# Altium schematic symbol library jlcpcb_2025_04_capacitors_extended_0603.schlib: 3668 symbols (part 19 of 20) (continued)
## TCC0603COG150K500CT
designator C?  Capacitance: 15pF  (hidden comment: *)
Capacitor, Ceramic (MLCC), 15pF, ±10%, 50V, C0G, ±10%, SMD 0603; Manufacturer: CCTC; Manufacturer Part Number: TCC0603COG150K500CT; Package Size: 0603; JLCPCB Basic Part: No; JLCPCB Part Number: C696849; Supplier 1: LCSC; Category: Capacitors - MLCC; Supplier Part Number 1: C696849; Tolerance: ±10%; Voltage Rating: 50V; Temperature Coefficient: C0G; RoHS: Yes; ComponentLink1Description: Datasheet; ComponentLink1URL: https://wmsc.lcsc.com/wmsc/upload/file/pdf/v2/lcsc/2304140030_CCTC-TCC0603COG150K500CT_C696849.pdf; ComponentLink2Description: JLCPCB Part URL; ComponentLink2URL: https://jlcpcb.com/partdetail/C696849; ComponentLink3Description: LCSC Part URL; ComponentLink3URL: https://lcsc.com/product-detail/Multilayer-Ceramic-Capacitors-MLCC---SMD-SMT_CCTC-CCTC-TCC0603COG150K500CT_C696849.html
footprint CAP-0603 (0603 (1608M) Capacitor)
pins: 1, 2

## TCC0603COG180J500CT
designator C?  Capacitance: 18pF  (hidden comment: *)
Capacitor, Ceramic (MLCC), 18pF, ±5%, 50V, C0G, ±5%, SMD 0603; Manufacturer: CCTC; Manufacturer Part Number: TCC0603COG180J500CT; Package Size: 0603; JLCPCB Basic Part: No; JLCPCB Part Number: C376770; Supplier 1: LCSC; Category: Capacitors - MLCC; Supplier Part Number 1: C376770; Tolerance: ±5%; Voltage Rating: 50V; Temperature Coefficient: C0G; RoHS: Yes; ComponentLink1Description: Datasheet; ComponentLink1URL: https://wmsc.lcsc.com/wmsc/upload/file/pdf/v2/lcsc/2304140030_CCTC-TCC0603COG180J500CT_C376770.pdf; ComponentLink2Description: JLCPCB Part URL; ComponentLink2URL: https://jlcpcb.com/partdetail/C376770; ComponentLink3Description: LCSC Part URL; ComponentLink3URL: https://lcsc.com/product-detail/Multilayer-Ceramic-Capacitors-MLCC---SMD-SMT_CCTC-CCTC-TCC0603COG180J500CT_C376770.html
footprint CAP-0603 (0603 (1608M) Capacitor)
pins: 1, 2

## TCC0603COG181J500CT
designator C?  Capacitance: 180pF  (hidden comment: *)
Capacitor, Ceramic (MLCC), 180pF, ±5%, 50V, C0G, ±5%, SMD 0603; Manufacturer: CCTC; Manufacturer Part Number: TCC0603COG181J500CT; Package Size: 0603; JLCPCB Basic Part: No; JLCPCB Part Number: C376771; Supplier 1: LCSC; Category: Capacitors - MLCC; Supplier Part Number 1: C376771; Tolerance: ±5%; Voltage Rating: 50V; Temperature Coefficient: C0G; RoHS: Yes; ComponentLink1Description: Datasheet; ComponentLink1URL: https://wmsc.lcsc.com/wmsc/upload/file/pdf/v2/lcsc/2304140030_CCTC-TCC0603COG181J500CT_C376771.pdf; ComponentLink2Description: JLCPCB Part URL; ComponentLink2URL: https://jlcpcb.com/partdetail/C376771; ComponentLink3Description: LCSC Part URL; ComponentLink3URL: https://lcsc.com/product-detail/Multilayer-Ceramic-Capacitors-MLCC---SMD-SMT_CCTC-CCTC-TCC0603COG181J500CT_C376771.html
footprint CAP-0603 (0603 (1608M) Capacitor)
pins: 1, 2

## TCC0603COG200J101CT
designator C?  Capacitance: 20pF  (hidden comment: *)
Capacitor, Ceramic (MLCC), 20pF, ±5%, 100V, C0G, ±5%, SMD 0603; Manufacturer: CCTC; Manufacturer Part Number: TCC0603COG200J101CT; Package Size: 0603; JLCPCB Basic Part: No; JLCPCB Part Number: C880611; Supplier 1: LCSC; Category: Capacitors - MLCC; Supplier Part Number 1: C880611; Tolerance: ±5%; Voltage Rating: 100V; Temperature Coefficient: C0G; RoHS: Yes; ComponentLink1Description: Datasheet; ComponentLink1URL: https://wmsc.lcsc.com/wmsc/upload/file/pdf/v2/lcsc/2304140030_CCTC-TCC0603COG200J101CT_C880611.pdf; ComponentLink2Description: JLCPCB Part URL; ComponentLink2URL: https://jlcpcb.com/partdetail/C880611; ComponentLink3Description: LCSC Part URL; ComponentLink3URL: https://lcsc.com/product-detail/Multilayer-Ceramic-Capacitors-MLCC---SMD-SMT_CCTC-CCTC-TCC0603COG200J101CT_C880611.html
footprint CAP-0603 (0603 (1608M) Capacitor)
pins: 1, 2

## TCC0603COG200J251CT
designator C?  Capacitance: 20pF  (hidden comment: *)
Capacitor, Ceramic (MLCC), 20pF, ±5%, 250V, C0G, ±5%, SMD 0603; Manufacturer: CCTC; Manufacturer Part Number: TCC0603COG200J251CT; Package Size: 0603; JLCPCB Basic Part: No; JLCPCB Part Number: C880626; Supplier 1: LCSC; Category: Capacitors - MLCC; Supplier Part Number 1: C880626; Tolerance: ±5%; Voltage Rating: 250V; Temperature Coefficient: C0G; RoHS: Yes; ComponentLink1Description: Datasheet; ComponentLink1URL: https://wmsc.lcsc.com/wmsc/upload/file/pdf/v2/lcsc/2304140030_CCTC-TCC0603COG200J251CT_C880626.pdf; ComponentLink2Description: JLCPCB Part URL; ComponentLink2URL: https://jlcpcb.com/partdetail/C880626; ComponentLink3Description: LCSC Part URL; ComponentLink3URL: https://lcsc.com/product-detail/Multilayer-Ceramic-Capacitors-MLCC---SMD-SMT_CCTC-CCTC-TCC0603COG200J251CT_C880626.html
footprint CAP-0603 (0603 (1608M) Capacitor)
pins: 1, 2

## TCC0603COG200J500CT
designator C?  Capacitance: 20pF  (hidden comment: *)
Capacitor, Ceramic (MLCC), 20pF, ±5%, 50V, C0G, ±5%, SMD 0603; Manufacturer: CCTC; Manufacturer Part Number: TCC0603COG200J500CT; Package Size: 0603; JLCPCB Basic Part: No; JLCPCB Part Number: C376774; Supplier 1: LCSC; Category: Capacitors - MLCC; Supplier Part Number 1: C376774; Tolerance: ±5%; Voltage Rating: 50V; Temperature Coefficient: C0G; RoHS: Yes; ComponentLink1Description: Datasheet; ComponentLink1URL: https://wmsc.lcsc.com/wmsc/upload/file/pdf/v2/lcsc/2304140030_CCTC-TCC0603COG200J500CT_C376774.pdf; ComponentLink2Description: JLCPCB Part URL; ComponentLink2URL: https://jlcpcb.com/partdetail/C376774; ComponentLink3Description: LCSC Part URL; ComponentLink3URL: https://lcsc.com/product-detail/Multilayer-Ceramic-Capacitors-MLCC---SMD-SMT_CCTC-CCTC-TCC0603COG200J500CT_C376774.html
footprint CAP-0603 (0603 (1608M) Capacitor)
pins: 1, 2

## TCC0603COG200K500CT
designator C?  Capacitance: 20pF  (hidden comment: *)
Capacitor, Ceramic (MLCC), 20pF, ±10%, 50V, C0G, ±10%, SMD 0603; Manufacturer: CCTC; Manufacturer Part Number: TCC0603COG200K500CT; Package Size: 0603; JLCPCB Basic Part: No; JLCPCB Part Number: C713506; Supplier 1: LCSC; Category: Capacitors - MLCC; Supplier Part Number 1: C713506; Tolerance: ±10%; Voltage Rating: 50V; Temperature Coefficient: C0G; RoHS: Yes; ComponentLink1Description: Datasheet; ComponentLink1URL: https://wmsc.lcsc.com/wmsc/upload/file/pdf/v2/lcsc/2304140030_CCTC-TCC0603COG200K500CT_C713506.pdf; ComponentLink2Description: JLCPCB Part URL; ComponentLink2URL: https://jlcpcb.com/partdetail/C713506; ComponentLink3Description: LCSC Part URL; ComponentLink3URL: https://lcsc.com/product-detail/Multilayer-Ceramic-Capacitors-MLCC---SMD-SMT_CCTC-CCTC-TCC0603COG200K500CT_C713506.html
footprint CAP-0603 (0603 (1608M) Capacitor)
pins: 1, 2

## TCC0603COG220J101CT
designator C?  Capacitance: 22pF  (hidden comment: *)
Capacitor, Ceramic (MLCC), 22pF, ±5%, 100V, C0G, ±5%, SMD 0603; Manufacturer: CCTC; Manufacturer Part Number: TCC0603COG220J101CT; Package Size: 0603; JLCPCB Basic Part: No; JLCPCB Part Number: C880642; Supplier 1: LCSC; Category: Capacitors - MLCC; Supplier Part Number 1: C880642; Tolerance: ±5%; Voltage Rating: 100V; Temperature Coefficient: C0G; RoHS: Yes; ComponentLink1Description: Datasheet; ComponentLink1URL: https://wmsc.lcsc.com/wmsc/upload/file/pdf/v2/lcsc/2304140030_CCTC-TCC0603COG220J101CT_C880642.pdf; ComponentLink2Description: JLCPCB Part URL; ComponentLink2URL: https://jlcpcb.com/partdetail/C880642; ComponentLink3Description: LCSC Part URL; ComponentLink3URL: https://lcsc.com/product-detail/Multilayer-Ceramic-Capacitors-MLCC---SMD-SMT_CCTC-CCTC-TCC0603COG220J101CT_C880642.html
footprint CAP-0603 (0603 (1608M) Capacitor)
pins: 1, 2

## TCC0603COG220J500CT
designator C?  Capacitance: 22pF  (hidden comment: *)
Capacitor, Ceramic (MLCC), 22pF, ±5%, 50V, C0G, ±5%, SMD 0603; Manufacturer: CCTC; Manufacturer Part Number: TCC0603COG220J500CT; Package Size: 0603; JLCPCB Basic Part: No; JLCPCB Part Number: C376775; Supplier 1: LCSC; Category: Capacitors - MLCC; Supplier Part Number 1: C376775; Tolerance: ±5%; Voltage Rating: 50V; Temperature Coefficient: C0G; RoHS: Yes; ComponentLink1Description: Datasheet; ComponentLink1URL: https://wmsc.lcsc.com/wmsc/upload/file/pdf/v2/lcsc/2304140030_CCTC-TCC0603COG220J500CT_C376775.pdf; ComponentLink2Description: JLCPCB Part URL; ComponentLink2URL: https://jlcpcb.com/partdetail/C376775; ComponentLink3Description: LCSC Part URL; ComponentLink3URL: https://lcsc.com/product-detail/Multilayer-Ceramic-Capacitors-MLCC---SMD-SMT_CCTC-CCTC-TCC0603COG220J500CT_C376775.html
footprint CAP-0603 (0603 (1608M) Capacitor)
pins: 1, 2

## TCC0603COG220K500CT
designator C?  Capacitance: 22pF  (hidden comment: *)
Capacitor, Ceramic (MLCC), 22pF, ±10%, null, null, ±10%, SMD 0603; Manufacturer: CCTC; Manufacturer Part Number: TCC0603COG220K500CT; Package Size: 0603; JLCPCB Basic Part: No; JLCPCB Part Number: C5360783; Supplier 1: LCSC; Category: Capacitors - MLCC; Supplier Part Number 1: C5360783; Tolerance: ±10%; Voltage Rating: null; Temperature Coefficient: null; RoHS: Yes; ComponentLink1Description: Datasheet; ComponentLink1URL: https://wmsc.lcsc.com/wmsc/upload/file/pdf/v2/lcsc/2302141837_CCTC-TCC0603COG220K500CT_C5360783.pdf; ComponentLink2Description: JLCPCB Part URL; ComponentLink2URL: https://jlcpcb.com/partdetail/C5360783; ComponentLink3Description: LCSC Part URL; ComponentLink3URL: https://lcsc.com/product-detail/Multilayer-Ceramic-Capacitors-MLCC---SMD-SMT_CCTC-CCTC-TCC0603COG220K500CT_C5360783.html
footprint CAP-0603 (0603 (1608M) Capacitor)
pins: 1, 2

## TCC0603COG221J500CT
designator C?  Capacitance: 220pF  (hidden comment: *)
Capacitor, Ceramic (MLCC), 220pF, ±5%, 50V, C0G, ±5%, SMD 0603; Manufacturer: CCTC; Manufacturer Part Number: TCC0603COG221J500CT; Package Size: 0603; JLCPCB Basic Part: No; JLCPCB Part Number: C376776; Supplier 1: LCSC; Category: Capacitors - MLCC; Supplier Part Number 1: C376776; Tolerance: ±5%; Voltage Rating: 50V; Temperature Coefficient: C0G; RoHS: Yes; ComponentLink1Description: Datasheet; ComponentLink1URL: https://wmsc.lcsc.com/wmsc/upload/file/pdf/v2/lcsc/2304140030_CCTC-TCC0603COG221J500CT_C376776.pdf; ComponentLink2Description: JLCPCB Part URL; ComponentLink2URL: https://jlcpcb.com/partdetail/C376776; ComponentLink3Description: LCSC Part URL; ComponentLink3URL: https://lcsc.com/product-detail/Multilayer-Ceramic-Capacitors-MLCC---SMD-SMT_CCTC-CCTC-TCC0603COG221J500CT_C376776.html
footprint CAP-0603 (0603 (1608M) Capacitor)
pins: 1, 2

## TCC0603COG222J500CT
designator C?  Capacitance: 2.2nF  (hidden comment: *)
Capacitor, Ceramic (MLCC), 2.2nF, ±5%, 50V, C0G, ±5%, SMD 0603; Manufacturer: CCTC; Manufacturer Part Number: TCC0603COG222J500CT; Package Size: 0603; JLCPCB Basic Part: No; JLCPCB Part Number: C380311; Supplier 1: LCSC; Category: Capacitors - MLCC; Supplier Part Number 1: C380311; Tolerance: ±5%; Voltage Rating: 50V; Temperature Coefficient: C0G; RoHS: Yes; ComponentLink1Description: Datasheet; ComponentLink1URL: https://wmsc.lcsc.com/wmsc/upload/file/pdf/v2/lcsc/2304140030_CCTC-TCC0603COG222J500CT_C380311.pdf; ComponentLink2Description: JLCPCB Part URL; ComponentLink2URL: https://jlcpcb.com/partdetail/C380311; ComponentLink3Description: LCSC Part URL; ComponentLink3URL: https://lcsc.com/product-detail/Multilayer-Ceramic-Capacitors-MLCC---SMD-SMT_CCTC-CCTC-TCC0603COG222J500CT_C380311.html
footprint CAP-0603 (0603 (1608M) Capacitor)
pins: 1, 2

## TCC0603COG240G500CT
designator C?  Capacitance: 24pF  (hidden comment: *)
Capacitor, Ceramic (MLCC), 24pF, ±2%, null, null, ±2%, SMD 0603; Manufacturer: CCTC; Manufacturer Part Number: TCC0603COG240G500CT; Package Size: 0603; JLCPCB Basic Part: No; JLCPCB Part Number: C5375817; Supplier 1: LCSC; Category: Capacitors - MLCC; Supplier Part Number 1: C5375817; Tolerance: ±2%; Voltage Rating: null; Temperature Coefficient: null; RoHS: Yes; ComponentLink1Description: Datasheet; ComponentLink2Description: JLCPCB Part URL; ComponentLink2URL: https://jlcpcb.com/partdetail/C5375817; ComponentLink3Description: LCSC Part URL; ComponentLink3URL: https://lcsc.com/product-detail/Multilayer-Ceramic-Capacitors-MLCC---SMD-SMT_CCTC-CCTC-TCC0603COG240G500CT_C5375817.html
footprint CAP-0603 (0603 (1608M) Capacitor)
pins: 1, 2

## TCC0603COG240J500CT
designator C?  Capacitance: 24pF  (hidden comment: *)
Capacitor, Ceramic (MLCC), 24pF, ±5%, 50V, C0G, ±5%, SMD 0603; Manufacturer: CCTC; Manufacturer Part Number: TCC0603COG240J500CT; Package Size: 0603; JLCPCB Basic Part: No; JLCPCB Part Number: C376777; Supplier 1: LCSC; Category: Capacitors - MLCC; Supplier Part Number 1: C376777; Tolerance: ±5%; Voltage Rating: 50V; Temperature Coefficient: C0G; RoHS: Yes; ComponentLink1Description: Datasheet; ComponentLink1URL: https://wmsc.lcsc.com/wmsc/upload/file/pdf/v2/lcsc/2304140030_CCTC-TCC0603COG240J500CT_C376777.pdf; ComponentLink2Description: JLCPCB Part URL; ComponentLink2URL: https://jlcpcb.com/partdetail/C376777; ComponentLink3Description: LCSC Part URL; ComponentLink3URL: https://lcsc.com/product-detail/Multilayer-Ceramic-Capacitors-MLCC---SMD-SMT_CCTC-CCTC-TCC0603COG240J500CT_C376777.html
footprint CAP-0603 (0603 (1608M) Capacitor)
pins: 1, 2

## TCC0603COG250G500CT
designator C?  Capacitance: 25pF  (hidden comment: *)
Capacitor, Ceramic (MLCC), 25pF, ±2%, 50V, null, ±2%, SMD 0603; Manufacturer: CCTC; Manufacturer Part Number: TCC0603COG250G500CT; Package Size: 0603; JLCPCB Basic Part: No; JLCPCB Part Number: C7393882; Supplier 1: LCSC; Category: Capacitors - MLCC; Supplier Part Number 1: C7393882; Tolerance: ±2%; Voltage Rating: 50V; Temperature Coefficient: null; RoHS: Yes; ComponentLink1Description: Datasheet; ComponentLink1URL: https://wmsc.lcsc.com/wmsc/upload/file/pdf/v2/lcsc/2306211554_CCTC-TCC0603COG250G500CT_C7393882.pdf; ComponentLink2Description: JLCPCB Part URL; ComponentLink2URL: https://jlcpcb.com/partdetail/C7393882; ComponentLink3Description: LCSC Part URL; ComponentLink3URL: https://lcsc.com/product-detail/Multilayer-Ceramic-Capacitors-MLCC---SMD-SMT_CCTC-CCTC-TCC0603COG250G500CT_C7393882.html
footprint CAP-0603 (0603 (1608M) Capacitor)
pins: 1, 2

## TCC0603COG250J500CT
designator C?  Capacitance: 25pF  (hidden comment: *)
Capacitor, Ceramic (MLCC), 25pF, ±5%, 50V, C0G, ±5%, SMD 0603; Manufacturer: CCTC; Manufacturer Part Number: TCC0603COG250J500CT; Package Size: 0603; JLCPCB Basic Part: No; JLCPCB Part Number: C282499; Supplier 1: LCSC; Category: Capacitors - MLCC; Supplier Part Number 1: C282499; Tolerance: ±5%; Voltage Rating: 50V; Temperature Coefficient: C0G; RoHS: Yes; ComponentLink1Description: Datasheet; ComponentLink1URL: https://wmsc.lcsc.com/wmsc/upload/file/pdf/v2/lcsc/2304140030_CCTC-TCC0603COG250J500CT_C282499.pdf; ComponentLink2Description: JLCPCB Part URL; ComponentLink2URL: https://jlcpcb.com/partdetail/C282499; ComponentLink3Description: LCSC Part URL; ComponentLink3URL: https://lcsc.com/product-detail/Multilayer-Ceramic-Capacitors-MLCC---SMD-SMT_CCTC-CCTC-TCC0603COG250J500CT_C282499.html
footprint CAP-0603 (0603 (1608M) Capacitor)
pins: 1, 2

## TCC0603COG270J101CT
designator C?  Capacitance: 27pF  (hidden comment: *)
Capacitor, Ceramic (MLCC), 27pF, ±5%, 100V, C0G, ±5%, SMD 0603; Manufacturer: CCTC; Manufacturer Part Number: TCC0603COG270J101CT; Package Size: 0603; JLCPCB Basic Part: No; JLCPCB Part Number: C880634; Supplier 1: LCSC; Category: Capacitors - MLCC; Supplier Part Number 1: C880634; Tolerance: ±5%; Voltage Rating: 100V; Temperature Coefficient: C0G; RoHS: Yes; ComponentLink1Description: Datasheet; ComponentLink1URL: https://wmsc.lcsc.com/wmsc/upload/file/pdf/v2/lcsc/2304140030_CCTC-TCC0603COG270J101CT_C880634.pdf; ComponentLink2Description: JLCPCB Part URL; ComponentLink2URL: https://jlcpcb.com/partdetail/C880634; ComponentLink3Description: LCSC Part URL; ComponentLink3URL: https://lcsc.com/product-detail/Multilayer-Ceramic-Capacitors-MLCC---SMD-SMT_CCTC-CCTC-TCC0603COG270J101CT_C880634.html
footprint CAP-0603 (0603 (1608M) Capacitor)
pins: 1, 2

## TCC0603COG270J500CT
designator C?  Capacitance: 27pF  (hidden comment: *)
Capacitor, Ceramic (MLCC), 27pF, ±5%, 50V, C0G, ±5%, SMD 0603; Manufacturer: CCTC; Manufacturer Part Number: TCC0603COG270J500CT; Package Size: 0603; JLCPCB Basic Part: No; JLCPCB Part Number: C376778; Supplier 1: LCSC; Category: Capacitors - MLCC; Supplier Part Number 1: C376778; Tolerance: ±5%; Voltage Rating: 50V; Temperature Coefficient: C0G; RoHS: Yes; ComponentLink1Description: Datasheet; ComponentLink1URL: https://wmsc.lcsc.com/wmsc/upload/file/pdf/v2/lcsc/2304140030_CCTC-TCC0603COG270J500CT_C376778.pdf; ComponentLink2Description: JLCPCB Part URL; ComponentLink2URL: https://jlcpcb.com/partdetail/C376778; ComponentLink3Description: LCSC Part URL; ComponentLink3URL: https://lcsc.com/product-detail/Multilayer-Ceramic-Capacitors-MLCC---SMD-SMT_CCTC-CCTC-TCC0603COG270J500CT_C376778.html
footprint CAP-0603 (0603 (1608M) Capacitor)
pins: 1, 2

## TCC0603COG271J500CT
designator C?  Capacitance: 270pF  (hidden comment: *)
Capacitor, Ceramic (MLCC), 270pF, ±5%, 50V, C0G, ±5%, SMD 0603; Manufacturer: CCTC; Manufacturer Part Number: TCC0603COG271J500CT; Package Size: 0603; JLCPCB Basic Part: No; JLCPCB Part Number: C376779; Supplier 1: LCSC; Category: Capacitors - MLCC; Supplier Part Number 1: C376779; Tolerance: ±5%; Voltage Rating: 50V; Temperature Coefficient: C0G; RoHS: Yes; ComponentLink1Description: Datasheet; ComponentLink1URL: https://wmsc.lcsc.com/wmsc/upload/file/pdf/v2/lcsc/2304140030_CCTC-TCC0603COG271J500CT_C376779.pdf; ComponentLink2Description: JLCPCB Part URL; ComponentLink2URL: https://jlcpcb.com/partdetail/C376779; ComponentLink3Description: LCSC Part URL; ComponentLink3URL: https://lcsc.com/product-detail/Multilayer-Ceramic-Capacitors-MLCC---SMD-SMT_CCTC-CCTC-TCC0603COG271J500CT_C376779.html
footprint CAP-0603 (0603 (1608M) Capacitor)
pins: 1, 2

## TCC0603COG300J101CT
designator C?  Capacitance: 30pF  (hidden comment: *)
Capacitor, Ceramic (MLCC), 30pF, ±5%, 100V, C0G, ±5%, SMD 0603; Manufacturer: CCTC; Manufacturer Part Number: TCC0603COG300J101CT; Package Size: 0603; JLCPCB Basic Part: No; JLCPCB Part Number: C696865; Supplier 1: LCSC; Category: Capacitors - MLCC; Supplier Part Number 1: C696865; Tolerance: ±5%; Voltage Rating: 100V; Temperature Coefficient: C0G; RoHS: Yes; ComponentLink1Description: Datasheet; ComponentLink1URL: https://wmsc.lcsc.com/wmsc/upload/file/pdf/v2/lcsc/2304140030_CCTC-TCC0603COG300J101CT_C696865.pdf; ComponentLink2Description: JLCPCB Part URL; ComponentLink2URL: https://jlcpcb.com/partdetail/C696865; ComponentLink3Description: LCSC Part URL; ComponentLink3URL: https://lcsc.com/product-detail/Multilayer-Ceramic-Capacitors-MLCC---SMD-SMT_CCTC-CCTC-TCC0603COG300J101CT_C696865.html
footprint CAP-0603 (0603 (1608M) Capacitor)
pins: 1, 2

## TCC0603COG300J251CT
designator C?  Capacitance: 30pF  (hidden comment: *)
Capacitor, Ceramic (MLCC), 30pF, ±5%, 250V, null, ±5%, SMD 0603; Manufacturer: CCTC; Manufacturer Part Number: TCC0603COG300J251CT; Package Size: 0603; JLCPCB Basic Part: No; JLCPCB Part Number: C5360861; Supplier 1: LCSC; Category: Capacitors - MLCC; Supplier Part Number 1: C5360861; Tolerance: ±5%; Voltage Rating: 250V; Temperature Coefficient: null; RoHS: Yes; ComponentLink1Description: Datasheet; ComponentLink1URL: https://wmsc.lcsc.com/wmsc/upload/file/pdf/v2/lcsc/2302141837_CCTC-TCC0603COG300J251CT_C5360861.pdf; ComponentLink2Description: JLCPCB Part URL; ComponentLink2URL: https://jlcpcb.com/partdetail/C5360861; ComponentLink3Description: LCSC Part URL; ComponentLink3URL: https://lcsc.com/product-detail/Multilayer-Ceramic-Capacitors-MLCC---SMD-SMT_CCTC-CCTC-TCC0603COG300J251CT_C5360861.html
footprint CAP-0603 (0603 (1608M) Capacitor)
pins: 1, 2

## TCC0603COG300J500CT
designator C?  Capacitance: 30pF  (hidden comment: *)
Capacitor, Ceramic (MLCC), 30pF, ±5%, 50V, C0G, ±5%, SMD 0603; Manufacturer: CCTC; Manufacturer Part Number: TCC0603COG300J500CT; Package Size: 0603; JLCPCB Basic Part: No; JLCPCB Part Number: C376782; Supplier 1: LCSC; Category: Capacitors - MLCC; Supplier Part Number 1: C376782; Tolerance: ±5%; Voltage Rating: 50V; Temperature Coefficient: C0G; RoHS: Yes; ComponentLink1Description: Datasheet; ComponentLink1URL: https://wmsc.lcsc.com/wmsc/upload/file/pdf/v2/lcsc/2304140030_CCTC-TCC0603COG300J500CT_C376782.pdf; ComponentLink2Description: JLCPCB Part URL; ComponentLink2URL: https://jlcpcb.com/partdetail/C376782; ComponentLink3Description: LCSC Part URL; ComponentLink3URL: https://lcsc.com/product-detail/Multilayer-Ceramic-Capacitors-MLCC---SMD-SMT_CCTC-CCTC-TCC0603COG300J500CT_C376782.html
footprint CAP-0603 (0603 (1608M) Capacitor)
pins: 1, 2

## TCC0603COG300K500CT
designator C?  Capacitance: 30pF  (hidden comment: *)
Capacitor, Ceramic (MLCC), 30pF, ±10%, 50V, C0G, ±10%, SMD 0603; Manufacturer: CCTC; Manufacturer Part Number: TCC0603COG300K500CT; Package Size: 0603; JLCPCB Basic Part: No; JLCPCB Part Number: C713507; Supplier 1: LCSC; Category: Capacitors - MLCC; Supplier Part Number 1: C713507; Tolerance: ±10%; Voltage Rating: 50V; Temperature Coefficient: C0G; RoHS: Yes; ComponentLink1Description: Datasheet; ComponentLink1URL: https://wmsc.lcsc.com/wmsc/upload/file/pdf/v2/lcsc/2304140030_CCTC-TCC0603COG300K500CT_C713507.pdf; ComponentLink2Description: JLCPCB Part URL; ComponentLink2URL: https://jlcpcb.com/partdetail/C713507; ComponentLink3Description: LCSC Part URL; ComponentLink3URL: https://lcsc.com/product-detail/Multilayer-Ceramic-Capacitors-MLCC---SMD-SMT_CCTC-CCTC-TCC0603COG300K500CT_C713507.html
footprint CAP-0603 (0603 (1608M) Capacitor)
pins: 1, 2

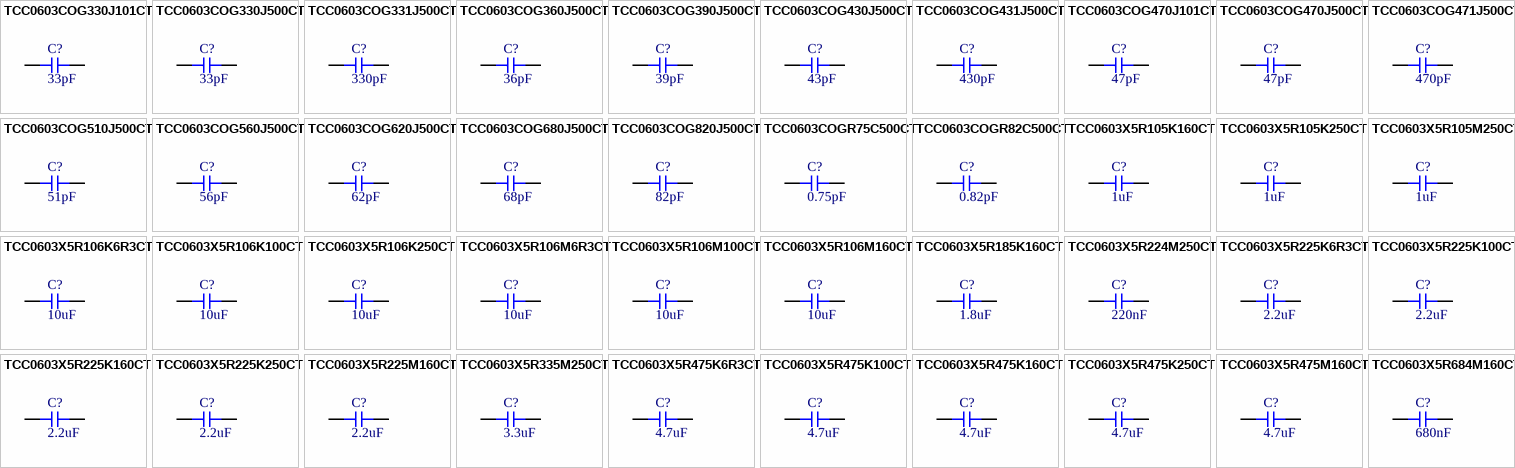
[diagram p86: symbols TCC0603COG330J101CT to TCC0603X5R684M160CT]

## TCC0603COG330J101CT
designator C?  Capacitance: 33pF  (hidden comment: *)
Capacitor, Ceramic (MLCC), 33pF, ±5%, 100V, C0G, ±5%, SMD 0603; Manufacturer: CCTC; Manufacturer Part Number: TCC0603COG330J101CT; Package Size: 0603; JLCPCB Basic Part: No; JLCPCB Part Number: C880633; Supplier 1: LCSC; Category: Capacitors - MLCC; Supplier Part Number 1: C880633; Tolerance: ±5%; Voltage Rating: 100V; Temperature Coefficient: C0G; RoHS: Yes; ComponentLink1Description: Datasheet; ComponentLink1URL: https://wmsc.lcsc.com/wmsc/upload/file/pdf/v2/lcsc/2304140030_CCTC-TCC0603COG330J101CT_C880633.pdf; ComponentLink2Description: JLCPCB Part URL; ComponentLink2URL: https://jlcpcb.com/partdetail/C880633; ComponentLink3Description: LCSC Part URL; ComponentLink3URL: https://lcsc.com/product-detail/Multilayer-Ceramic-Capacitors-MLCC---SMD-SMT_CCTC-CCTC-TCC0603COG330J101CT_C880633.html
footprint CAP-0603 (0603 (1608M) Capacitor)
pins: 1, 2

## TCC0603COG330J500CT
designator C?  Capacitance: 33pF  (hidden comment: *)
Capacitor, Ceramic (MLCC), 33pF, ±5%, 50V, C0G, ±5%, SMD 0603; Manufacturer: CCTC; Manufacturer Part Number: TCC0603COG330J500CT; Package Size: 0603; JLCPCB Basic Part: No; JLCPCB Part Number: C282501; Supplier 1: LCSC; Category: Capacitors - MLCC; Supplier Part Number 1: C282501; Tolerance: ±5%; Voltage Rating: 50V; Temperature Coefficient: C0G; RoHS: Yes; ComponentLink1Description: Datasheet; ComponentLink1URL: https://wmsc.lcsc.com/wmsc/upload/file/pdf/v2/lcsc/2304140030_CCTC-TCC0603COG330J500CT_C282501.pdf; ComponentLink2Description: JLCPCB Part URL; ComponentLink2URL: https://jlcpcb.com/partdetail/C282501; ComponentLink3Description: LCSC Part URL; ComponentLink3URL: https://lcsc.com/product-detail/Multilayer-Ceramic-Capacitors-MLCC---SMD-SMT_CCTC-CCTC-TCC0603COG330J500CT_C282501.html
footprint CAP-0603 (0603 (1608M) Capacitor)
pins: 1, 2

## TCC0603COG331J500CT
designator C?  Capacitance: 330pF  (hidden comment: *)
Capacitor, Ceramic (MLCC), 330pF, ±5%, 50V, C0G, ±5%, SMD 0603; Manufacturer: CCTC; Manufacturer Part Number: TCC0603COG331J500CT; Package Size: 0603; JLCPCB Basic Part: No; JLCPCB Part Number: C376783; Supplier 1: LCSC; Category: Capacitors - MLCC; Supplier Part Number 1: C376783; Tolerance: ±5%; Voltage Rating: 50V; Temperature Coefficient: C0G; RoHS: Yes; ComponentLink1Description: Datasheet; ComponentLink1URL: https://wmsc.lcsc.com/wmsc/upload/file/pdf/v2/lcsc/2304140030_CCTC-TCC0603COG331J500CT_C376783.pdf; ComponentLink2Description: JLCPCB Part URL; ComponentLink2URL: https://jlcpcb.com/partdetail/C376783; ComponentLink3Description: LCSC Part URL; ComponentLink3URL: https://lcsc.com/product-detail/Multilayer-Ceramic-Capacitors-MLCC---SMD-SMT_CCTC-CCTC-TCC0603COG331J500CT_C376783.html
footprint CAP-0603 (0603 (1608M) Capacitor)
pins: 1, 2

## TCC0603COG360J500CT
designator C?  Capacitance: 36pF  (hidden comment: *)
Capacitor, Ceramic (MLCC), 36pF, ±5%, 50V, C0G, ±5%, SMD 0603; Manufacturer: CCTC; Manufacturer Part Number: TCC0603COG360J500CT; Package Size: 0603; JLCPCB Basic Part: No; JLCPCB Part Number: C282502; Supplier 1: LCSC; Category: Capacitors - MLCC; Supplier Part Number 1: C282502; Tolerance: ±5%; Voltage Rating: 50V; Temperature Coefficient: C0G; RoHS: Yes; ComponentLink1Description: Datasheet; ComponentLink1URL: https://wmsc.lcsc.com/wmsc/upload/file/pdf/v2/lcsc/2304140030_CCTC-TCC0603COG360J500CT_C282502.pdf; ComponentLink2Description: JLCPCB Part URL; ComponentLink2URL: https://jlcpcb.com/partdetail/C282502; ComponentLink3Description: LCSC Part URL; ComponentLink3URL: https://lcsc.com/product-detail/Multilayer-Ceramic-Capacitors-MLCC---SMD-SMT_CCTC-CCTC-TCC0603COG360J500CT_C282502.html
footprint CAP-0603 (0603 (1608M) Capacitor)
pins: 1, 2

## TCC0603COG390J500CT
designator C?  Capacitance: 39pF  (hidden comment: *)
Capacitor, Ceramic (MLCC), 39pF, ±5%, 50V, C0G, ±5%, SMD 0603; Manufacturer: CCTC; Manufacturer Part Number: TCC0603COG390J500CT; Package Size: 0603; JLCPCB Basic Part: No; JLCPCB Part Number: C376784; Supplier 1: LCSC; Category: Capacitors - MLCC; Supplier Part Number 1: C376784; Tolerance: ±5%; Voltage Rating: 50V; Temperature Coefficient: C0G; RoHS: Yes; ComponentLink1Description: Datasheet; ComponentLink1URL: https://wmsc.lcsc.com/wmsc/upload/file/pdf/v2/lcsc/2304140030_CCTC-TCC0603COG390J500CT_C376784.pdf; ComponentLink2Description: JLCPCB Part URL; ComponentLink2URL: https://jlcpcb.com/partdetail/C376784; ComponentLink3Description: LCSC Part URL; ComponentLink3URL: https://lcsc.com/product-detail/Multilayer-Ceramic-Capacitors-MLCC---SMD-SMT_CCTC-CCTC-TCC0603COG390J500CT_C376784.html
footprint CAP-0603 (0603 (1608M) Capacitor)
pins: 1, 2

## TCC0603COG430J500CT
designator C?  Capacitance: 43pF  (hidden comment: *)
Capacitor, Ceramic (MLCC), 43pF, ±5%, 50V, C0G, ±5%, SMD 0603; Manufacturer: CCTC; Manufacturer Part Number: TCC0603COG430J500CT; Package Size: 0603; JLCPCB Basic Part: No; JLCPCB Part Number: C376786; Supplier 1: LCSC; Category: Capacitors - MLCC; Supplier Part Number 1: C376786; Tolerance: ±5%; Voltage Rating: 50V; Temperature Coefficient: C0G; RoHS: Yes; ComponentLink1Description: Datasheet; ComponentLink1URL: https://wmsc.lcsc.com/wmsc/upload/file/pdf/v2/lcsc/2304140030_CCTC-TCC0603COG430J500CT_C376786.pdf; ComponentLink2Description: JLCPCB Part URL; ComponentLink2URL: https://jlcpcb.com/partdetail/C376786; ComponentLink3Description: LCSC Part URL; ComponentLink3URL: https://lcsc.com/product-detail/Multilayer-Ceramic-Capacitors-MLCC---SMD-SMT_CCTC-CCTC-TCC0603COG430J500CT_C376786.html
footprint CAP-0603 (0603 (1608M) Capacitor)
pins: 1, 2

## TCC0603COG431J500CT
designator C?  Capacitance: 430pF  (hidden comment: *)
Capacitor, Ceramic (MLCC), 430pF, ±5%, 50V, C0G, ±5%, SMD 0603; Manufacturer: CCTC; Manufacturer Part Number: TCC0603COG431J500CT; Package Size: 0603; JLCPCB Basic Part: No; JLCPCB Part Number: C376787; Supplier 1: LCSC; Category: Capacitors - MLCC; Supplier Part Number 1: C376787; Tolerance: ±5%; Voltage Rating: 50V; Temperature Coefficient: C0G; RoHS: Yes; ComponentLink1Description: Datasheet; ComponentLink1URL: https://wmsc.lcsc.com/wmsc/upload/file/pdf/v2/lcsc/2304140030_CCTC-TCC0603COG431J500CT_C376787.pdf; ComponentLink2Description: JLCPCB Part URL; ComponentLink2URL: https://jlcpcb.com/partdetail/C376787; ComponentLink3Description: LCSC Part URL; ComponentLink3URL: https://lcsc.com/product-detail/Multilayer-Ceramic-Capacitors-MLCC---SMD-SMT_CCTC-CCTC-TCC0603COG431J500CT_C376787.html
footprint CAP-0603 (0603 (1608M) Capacitor)
pins: 1, 2

## TCC0603COG470J101CT
designator C?  Capacitance: 47pF  (hidden comment: *)
Capacitor, Ceramic (MLCC), 47pF, ±5%, 100V, C0G, ±5%, SMD 0603; Manufacturer: CCTC; Manufacturer Part Number: TCC0603COG470J101CT; Package Size: 0603; JLCPCB Basic Part: No; JLCPCB Part Number: C880628; Supplier 1: LCSC; Category: Capacitors - MLCC; Supplier Part Number 1: C880628; Tolerance: ±5%; Voltage Rating: 100V; Temperature Coefficient: C0G; RoHS: Yes; ComponentLink1Description: Datasheet; ComponentLink1URL: https://wmsc.lcsc.com/wmsc/upload/file/pdf/v2/lcsc/2304140030_CCTC-TCC0603COG470J101CT_C880628.pdf; ComponentLink2Description: JLCPCB Part URL; ComponentLink2URL: https://jlcpcb.com/partdetail/C880628; ComponentLink3Description: LCSC Part URL; ComponentLink3URL: https://lcsc.com/product-detail/Multilayer-Ceramic-Capacitors-MLCC---SMD-SMT_CCTC-CCTC-TCC0603COG470J101CT_C880628.html
footprint CAP-0603 (0603 (1608M) Capacitor)
pins: 1, 2

## TCC0603COG470J500CT
designator C?  Capacitance: 47pF  (hidden comment: *)
Capacitor, Ceramic (MLCC), 47pF, ±5%, 50V, C0G, ±5%, SMD 0603; Manufacturer: CCTC; Manufacturer Part Number: TCC0603COG470J500CT; Package Size: 0603; JLCPCB Basic Part: No; JLCPCB Part Number: C282505; Supplier 1: LCSC; Category: Capacitors - MLCC; Supplier Part Number 1: C282505; Tolerance: ±5%; Voltage Rating: 50V; Temperature Coefficient: C0G; RoHS: Yes; ComponentLink1Description: Datasheet; ComponentLink1URL: https://wmsc.lcsc.com/wmsc/upload/file/pdf/v2/lcsc/2304140030_CCTC-TCC0603COG470J500CT_C282505.pdf; ComponentLink2Description: JLCPCB Part URL; ComponentLink2URL: https://jlcpcb.com/partdetail/C282505; ComponentLink3Description: LCSC Part URL; ComponentLink3URL: https://lcsc.com/product-detail/Multilayer-Ceramic-Capacitors-MLCC---SMD-SMT_CCTC-CCTC-TCC0603COG470J500CT_C282505.html
footprint CAP-0603 (0603 (1608M) Capacitor)
pins: 1, 2

## TCC0603COG471J500CT
designator C?  Capacitance: 470pF  (hidden comment: *)
Capacitor, Ceramic (MLCC), 470pF, ±5%, 50V, C0G, ±5%, SMD 0603; Manufacturer: CCTC; Manufacturer Part Number: TCC0603COG471J500CT; Package Size: 0603; JLCPCB Basic Part: No; JLCPCB Part Number: C376788; Supplier 1: LCSC; Category: Capacitors - MLCC; Supplier Part Number 1: C376788; Tolerance: ±5%; Voltage Rating: 50V; Temperature Coefficient: C0G; RoHS: Yes; ComponentLink1Description: Datasheet; ComponentLink1URL: https://wmsc.lcsc.com/wmsc/upload/file/pdf/v2/lcsc/2304140030_CCTC-TCC0603COG471J500CT_C376788.pdf; ComponentLink2Description: JLCPCB Part URL; ComponentLink2URL: https://jlcpcb.com/partdetail/C376788; ComponentLink3Description: LCSC Part URL; ComponentLink3URL: https://lcsc.com/product-detail/Multilayer-Ceramic-Capacitors-MLCC---SMD-SMT_CCTC-CCTC-TCC0603COG471J500CT_C376788.html
footprint CAP-0603 (0603 (1608M) Capacitor)
pins: 1, 2

## TCC0603COG510J500CT
designator C?  Capacitance: 51pF  (hidden comment: *)
Capacitor, Ceramic (MLCC), 51pF, ±5%, 50V, C0G, ±5%, SMD 0603; Manufacturer: CCTC; Manufacturer Part Number: TCC0603COG510J500CT; Package Size: 0603; JLCPCB Basic Part: No; JLCPCB Part Number: C376793; Supplier 1: LCSC; Category: Capacitors - MLCC; Supplier Part Number 1: C376793; Tolerance: ±5%; Voltage Rating: 50V; Temperature Coefficient: C0G; RoHS: Yes; ComponentLink1Description: Datasheet; ComponentLink1URL: https://wmsc.lcsc.com/wmsc/upload/file/pdf/v2/lcsc/2304140030_CCTC-TCC0603COG510J500CT_C376793.pdf; ComponentLink2Description: JLCPCB Part URL; ComponentLink2URL: https://jlcpcb.com/partdetail/C376793; ComponentLink3Description: LCSC Part URL; ComponentLink3URL: https://lcsc.com/product-detail/Multilayer-Ceramic-Capacitors-MLCC---SMD-SMT_CCTC-CCTC-TCC0603COG510J500CT_C376793.html
footprint CAP-0603 (0603 (1608M) Capacitor)
pins: 1, 2

## TCC0603COG560J500CT
designator C?  Capacitance: 56pF  (hidden comment: *)
Capacitor, Ceramic (MLCC), 56pF, ±5%, 50V, C0G, ±5%, SMD 0603; Manufacturer: CCTC; Manufacturer Part Number: TCC0603COG560J500CT; Package Size: 0603; JLCPCB Basic Part: No; JLCPCB Part Number: C282507; Supplier 1: LCSC; Category: Capacitors - MLCC; Supplier Part Number 1: C282507; Tolerance: ±5%; Voltage Rating: 50V; Temperature Coefficient: C0G; RoHS: Yes; ComponentLink1Description: Datasheet; ComponentLink1URL: https://wmsc.lcsc.com/wmsc/upload/file/pdf/v2/lcsc/2304140030_CCTC-TCC0603COG560J500CT_C282507.pdf; ComponentLink2Description: JLCPCB Part URL; ComponentLink2URL: https://jlcpcb.com/partdetail/C282507; ComponentLink3Description: LCSC Part URL; ComponentLink3URL: https://lcsc.com/product-detail/Multilayer-Ceramic-Capacitors-MLCC---SMD-SMT_CCTC-CCTC-TCC0603COG560J500CT_C282507.html
footprint CAP-0603 (0603 (1608M) Capacitor)
pins: 1, 2

## TCC0603COG620J500CT
designator C?  Capacitance: 62pF  (hidden comment: *)
Capacitor, Ceramic (MLCC), 62pF, ±5%, 50V, C0G, ±5%, SMD 0603; Manufacturer: CCTC; Manufacturer Part Number: TCC0603COG620J500CT; Package Size: 0603; JLCPCB Basic Part: No; JLCPCB Part Number: C376798; Supplier 1: LCSC; Category: Capacitors - MLCC; Supplier Part Number 1: C376798; Tolerance: ±5%; Voltage Rating: 50V; Temperature Coefficient: C0G; RoHS: Yes; ComponentLink1Description: Datasheet; ComponentLink1URL: https://wmsc.lcsc.com/wmsc/upload/file/pdf/v2/lcsc/2304140030_CCTC-TCC0603COG620J500CT_C376798.pdf; ComponentLink2Description: JLCPCB Part URL; ComponentLink2URL: https://jlcpcb.com/partdetail/C376798; ComponentLink3Description: LCSC Part URL; ComponentLink3URL: https://lcsc.com/product-detail/Multilayer-Ceramic-Capacitors-MLCC---SMD-SMT_CCTC-CCTC-TCC0603COG620J500CT_C376798.html
footprint CAP-0603 (0603 (1608M) Capacitor)
pins: 1, 2

## TCC0603COG680J500CT
designator C?  Capacitance: 68pF  (hidden comment: *)
Capacitor, Ceramic (MLCC), 68pF, ±5%, 50V, C0G, ±5%, SMD 0603; Manufacturer: CCTC; Manufacturer Part Number: TCC0603COG680J500CT; Package Size: 0603; JLCPCB Basic Part: No; JLCPCB Part Number: C374072; Supplier 1: LCSC; Category: Capacitors - MLCC; Supplier Part Number 1: C374072; Tolerance: ±5%; Voltage Rating: 50V; Temperature Coefficient: C0G; RoHS: Yes; ComponentLink1Description: Datasheet; ComponentLink1URL: https://wmsc.lcsc.com/wmsc/upload/file/pdf/v2/lcsc/2304140030_CCTC-TCC0603COG680J500CT_C374072.pdf; ComponentLink2Description: JLCPCB Part URL; ComponentLink2URL: https://jlcpcb.com/partdetail/C374072; ComponentLink3Description: LCSC Part URL; ComponentLink3URL: https://lcsc.com/product-detail/Multilayer-Ceramic-Capacitors-MLCC---SMD-SMT_CCTC-CCTC-TCC0603COG680J500CT_C374072.html
footprint CAP-0603 (0603 (1608M) Capacitor)
pins: 1, 2

## TCC0603COG820J500CT
designator C?  Capacitance: 82pF  (hidden comment: *)
Capacitor, Ceramic (MLCC), 82pF, ±5%, 50V, C0G, ±5%, SMD 0603; Manufacturer: CCTC; Manufacturer Part Number: TCC0603COG820J500CT; Package Size: 0603; JLCPCB Basic Part: No; JLCPCB Part Number: C282510; Supplier 1: LCSC; Category: Capacitors - MLCC; Supplier Part Number 1: C282510; Tolerance: ±5%; Voltage Rating: 50V; Temperature Coefficient: C0G; RoHS: Yes; ComponentLink1Description: Datasheet; ComponentLink1URL: https://wmsc.lcsc.com/wmsc/upload/file/pdf/v2/lcsc/2304140030_CCTC-TCC0603COG820J500CT_C282510.pdf; ComponentLink2Description: JLCPCB Part URL; ComponentLink2URL: https://jlcpcb.com/partdetail/C282510; ComponentLink3Description: LCSC Part URL; ComponentLink3URL: https://lcsc.com/product-detail/Multilayer-Ceramic-Capacitors-MLCC---SMD-SMT_CCTC-CCTC-TCC0603COG820J500CT_C282510.html
footprint CAP-0603 (0603 (1608M) Capacitor)
pins: 1, 2

## TCC0603COGR75C500CT
designator C?  Capacitance: 0.75pF  (hidden comment: *)
Capacitor, Ceramic (MLCC), 0.75pF, 50V, C0G, SMD 0603; Manufacturer: CCTC; Manufacturer Part Number: TCC0603COGR75C500CT; Package Size: 0603; JLCPCB Basic Part: No; JLCPCB Part Number: C376806; Supplier 1: LCSC; Category: Capacitors - MLCC; Supplier Part Number 1: C376806; Voltage Rating: 50V; Temperature Coefficient: C0G; RoHS: Yes; ComponentLink1Description: Datasheet; ComponentLink1URL: https://wmsc.lcsc.com/wmsc/upload/file/pdf/v2/lcsc/2304140030_CCTC-TCC0603COGR75C500CT_C376806.pdf; ComponentLink2Description: JLCPCB Part URL; ComponentLink2URL: https://jlcpcb.com/partdetail/C376806; ComponentLink3Description: LCSC Part URL; ComponentLink3URL: https://lcsc.com/product-detail/Multilayer-Ceramic-Capacitors-MLCC---SMD-SMT_CCTC-CCTC-TCC0603COGR75C500CT_C376806.html
footprint CAP-0603 (0603 (1608M) Capacitor)
pins: 1, 2

## TCC0603COGR82C500CT
designator C?  Capacitance: 0.82pF  (hidden comment: *)
Capacitor, Ceramic (MLCC), 0.82pF, 50V, null, SMD 0603; Manufacturer: CCTC; Manufacturer Part Number: TCC0603COGR82C500CT; Package Size: 0603; JLCPCB Basic Part: No; JLCPCB Part Number: C7393891; Supplier 1: LCSC; Category: Capacitors - MLCC; Supplier Part Number 1: C7393891; Voltage Rating: 50V; Temperature Coefficient: null; RoHS: Yes; ComponentLink1Description: Datasheet; ComponentLink1URL: https://wmsc.lcsc.com/wmsc/upload/file/pdf/v2/lcsc/2306211554_CCTC-TCC0603COGR82C500CT_C7393891.pdf; ComponentLink2Description: JLCPCB Part URL; ComponentLink2URL: https://jlcpcb.com/partdetail/C7393891; ComponentLink3Description: LCSC Part URL; ComponentLink3URL: https://lcsc.com/product-detail/Multilayer-Ceramic-Capacitors-MLCC---SMD-SMT_CCTC-CCTC-TCC0603COGR82C500CT_C7393891.html
footprint CAP-0603 (0603 (1608M) Capacitor)
pins: 1, 2

## TCC0603X5R105K160CT
designator C?  Capacitance: 1uF  (hidden comment: *)
Capacitor, Ceramic (MLCC), 1uF, ±10%, 16V, X5R, ±10%, SMD 0603; Manufacturer: CCTC; Manufacturer Part Number: TCC0603X5R105K160CT; Package Size: 0603; JLCPCB Basic Part: No; JLCPCB Part Number: C696901; Supplier 1: LCSC; Category: Capacitors - MLCC; Supplier Part Number 1: C696901; Tolerance: ±10%; Voltage Rating: 16V; Temperature Coefficient: X5R; RoHS: Yes; ComponentLink1Description: Datasheet; ComponentLink1URL: https://wmsc.lcsc.com/wmsc/upload/file/pdf/v2/lcsc/2304140030_CCTC-TCC0603X5R105K160CT_C696901.pdf; ComponentLink2Description: JLCPCB Part URL; ComponentLink2URL: https://jlcpcb.com/partdetail/C696901; ComponentLink3Description: LCSC Part URL; ComponentLink3URL: https://lcsc.com/product-detail/Multilayer-Ceramic-Capacitors-MLCC---SMD-SMT_CCTC-CCTC-TCC0603X5R105K160CT_C696901.html
footprint CAP-0603 (0603 (1608M) Capacitor)
pins: 1, 2

## TCC0603X5R105K250CT
designator C?  Capacitance: 1uF  (hidden comment: *)
Capacitor, Ceramic (MLCC), 1uF, ±10%, 25V, X5R, ±10%, SMD 0603; Manufacturer: CCTC; Manufacturer Part Number: TCC0603X5R105K250CT; Package Size: 0603; JLCPCB Basic Part: No; JLCPCB Part Number: C696843; Supplier 1: LCSC; Category: Capacitors - MLCC; Supplier Part Number 1: C696843; Tolerance: ±10%; Voltage Rating: 25V; Temperature Coefficient: X5R; RoHS: Yes; ComponentLink1Description: Datasheet; ComponentLink1URL: https://wmsc.lcsc.com/wmsc/upload/file/pdf/v2/lcsc/2304140030_CCTC-TCC0603X5R105K250CT_C696843.pdf; ComponentLink2Description: JLCPCB Part URL; ComponentLink2URL: https://jlcpcb.com/partdetail/C696843; ComponentLink3Description: LCSC Part URL; ComponentLink3URL: https://lcsc.com/product-detail/Multilayer-Ceramic-Capacitors-MLCC---SMD-SMT_CCTC-CCTC-TCC0603X5R105K250CT_C696843.html
footprint CAP-0603 (0603 (1608M) Capacitor)
pins: 1, 2

## TCC0603X5R105M250CT
designator C?  Capacitance: 1uF  (hidden comment: *)
Capacitor, Ceramic (MLCC), 1uF, ±20%, 25V, X5R, ±20%, SMD 0603; Manufacturer: CCTC; Manufacturer Part Number: TCC0603X5R105M250CT; Package Size: 0603; JLCPCB Basic Part: No; JLCPCB Part Number: C6266891; Supplier 1: LCSC; Category: Capacitors - MLCC; Supplier Part Number 1: C6266891; Tolerance: ±20%; Voltage Rating: 25V; Temperature Coefficient: X5R; RoHS: Yes; ComponentLink1Description: Datasheet; ComponentLink1URL: https://wmsc.lcsc.com/wmsc/upload/file/pdf/v2/lcsc/2305171520_CCTC-TCC0603X5R105M250CT_C6266891.pdf; ComponentLink2Description: JLCPCB Part URL; ComponentLink2URL: https://jlcpcb.com/partdetail/C6266891; ComponentLink3Description: LCSC Part URL; ComponentLink3URL: https://lcsc.com/product-detail/Multilayer-Ceramic-Capacitors-MLCC---SMD-SMT_CCTC-CCTC-TCC0603X5R105M250CT_C6266891.html
footprint CAP-0603 (0603 (1608M) Capacitor)
pins: 1, 2

## TCC0603X5R106K6R3CT
designator C?  Capacitance: 10uF  (hidden comment: *)
Capacitor, Ceramic (MLCC), 10uF, ±10%, 6.3V, X5R, ±10%, SMD 0603; Manufacturer: CCTC; Manufacturer Part Number: TCC0603X5R106K6R3CT; Package Size: 0603; JLCPCB Basic Part: No; JLCPCB Part Number: C380315; Supplier 1: LCSC; Category: Capacitors - MLCC; Supplier Part Number 1: C380315; Tolerance: ±10%; Voltage Rating: 6.3V; Temperature Coefficient: X5R; RoHS: Yes; ComponentLink1Description: Datasheet; ComponentLink1URL: https://wmsc.lcsc.com/wmsc/upload/file/pdf/v2/lcsc/2304140030_CCTC-TCC0603X5R106K6R3CT_C380315.pdf; ComponentLink2Description: JLCPCB Part URL; ComponentLink2URL: https://jlcpcb.com/partdetail/C380315; ComponentLink3Description: LCSC Part URL; ComponentLink3URL: https://lcsc.com/product-detail/Multilayer-Ceramic-Capacitors-MLCC---SMD-SMT_CCTC-CCTC-TCC0603X5R106K6R3CT_C380315.html
footprint CAP-0603 (0603 (1608M) Capacitor)
pins: 1, 2

## TCC0603X5R106K100CT
designator C?  Capacitance: 10uF  (hidden comment: *)
Capacitor, Ceramic (MLCC), 10uF, ±10%, 10V, X5R, ±10%, SMD 0603; Manufacturer: CCTC; Manufacturer Part Number: TCC0603X5R106K100CT; Package Size: 0603; JLCPCB Basic Part: No; JLCPCB Part Number: C380314; Supplier 1: LCSC; Category: Capacitors - MLCC; Supplier Part Number 1: C380314; Tolerance: ±10%; Voltage Rating: 10V; Temperature Coefficient: X5R; RoHS: Yes; ComponentLink1Description: Datasheet; ComponentLink1URL: https://wmsc.lcsc.com/wmsc/upload/file/pdf/v2/lcsc/2304140030_CCTC-TCC0603X5R106K100CT_C380314.pdf; ComponentLink2Description: JLCPCB Part URL; ComponentLink2URL: https://jlcpcb.com/partdetail/C380314; ComponentLink3Description: LCSC Part URL; ComponentLink3URL: https://lcsc.com/product-detail/Multilayer-Ceramic-Capacitors-MLCC---SMD-SMT_CCTC-CCTC-TCC0603X5R106K100CT_C380314.html
footprint CAP-0603 (0603 (1608M) Capacitor)
pins: 1, 2

## TCC0603X5R106K250CT
designator C?  Capacitance: 10uF  (hidden comment: *)
Capacitor, Ceramic (MLCC), 10uF, ±10%, 25V, X5R, ±10%, SMD 0603; Manufacturer: CCTC; Manufacturer Part Number: TCC0603X5R106K250CT; Package Size: 0603; JLCPCB Basic Part: No; JLCPCB Part Number: C7393892; Supplier 1: LCSC; Category: Capacitors - MLCC; Supplier Part Number 1: C7393892; Tolerance: ±10%; Voltage Rating: 25V; Temperature Coefficient: X5R; RoHS: Yes; ComponentLink1Description: Datasheet; ComponentLink1URL: https://wmsc.lcsc.com/wmsc/upload/file/pdf/v2/lcsc/2306211554_CCTC-TCC0603X5R106K250CT_C7393892.pdf; ComponentLink2Description: JLCPCB Part URL; ComponentLink2URL: https://jlcpcb.com/partdetail/C7393892; ComponentLink3Description: LCSC Part URL; ComponentLink3URL: https://lcsc.com/product-detail/Multilayer-Ceramic-Capacitors-MLCC---SMD-SMT_CCTC-CCTC-TCC0603X5R106K250CT_C7393892.html
footprint CAP-0603 (0603 (1608M) Capacitor)
pins: 1, 2

## TCC0603X5R106M6R3CT
designator C?  Capacitance: 10uF  (hidden comment: *)
Capacitor, Ceramic (MLCC), 10uF, ±20%, 6.3V, X5R, ±20%, SMD 0603; Manufacturer: CCTC; Manufacturer Part Number: TCC0603X5R106M6R3CT; Package Size: 0603; JLCPCB Basic Part: No; JLCPCB Part Number: C380318; Supplier 1: LCSC; Category: Capacitors - MLCC; Supplier Part Number 1: C380318; Tolerance: ±20%; Voltage Rating: 6.3V; Temperature Coefficient: X5R; RoHS: Yes; ComponentLink1Description: Datasheet; ComponentLink1URL: https://wmsc.lcsc.com/wmsc/upload/file/pdf/v2/lcsc/2304140030_CCTC-TCC0603X5R106M6R3CT_C380318.pdf; ComponentLink2Description: JLCPCB Part URL; ComponentLink2URL: https://jlcpcb.com/partdetail/C380318; ComponentLink3Description: LCSC Part URL; ComponentLink3URL: https://lcsc.com/product-detail/Multilayer-Ceramic-Capacitors-MLCC---SMD-SMT_CCTC-CCTC-TCC0603X5R106M6R3CT_C380318.html
footprint CAP-0603 (0603 (1608M) Capacitor)
pins: 1, 2

## TCC0603X5R106M100CT
designator C?  Capacitance: 10uF  (hidden comment: *)
Capacitor, Ceramic (MLCC), 10uF, ±20%, 10V, X5R, ±20%, SMD 0603; Manufacturer: CCTC; Manufacturer Part Number: TCC0603X5R106M100CT; Package Size: 0603; JLCPCB Basic Part: No; JLCPCB Part Number: C380316; Supplier 1: LCSC; Category: Capacitors - MLCC; Supplier Part Number 1: C380316; Tolerance: ±20%; Voltage Rating: 10V; Temperature Coefficient: X5R; RoHS: Yes; ComponentLink1Description: Datasheet; ComponentLink1URL: https://wmsc.lcsc.com/wmsc/upload/file/pdf/v2/lcsc/2304140030_CCTC-TCC0603X5R106M100CT_C380316.pdf; ComponentLink2Description: JLCPCB Part URL; ComponentLink2URL: https://jlcpcb.com/partdetail/C380316; ComponentLink3Description: LCSC Part URL; ComponentLink3URL: https://lcsc.com/product-detail/Multilayer-Ceramic-Capacitors-MLCC---SMD-SMT_CCTC-CCTC-TCC0603X5R106M100CT_C380316.html
footprint CAP-0603 (0603 (1608M) Capacitor)
pins: 1, 2

## TCC0603X5R106M160CT
designator C?  Capacitance: 10uF  (hidden comment: *)
Capacitor, Ceramic (MLCC), 10uF, ±20%, 16V, X5R, ±20%, SMD 0603; Manufacturer: CCTC; Manufacturer Part Number: TCC0603X5R106M160CT; Package Size: 0603; JLCPCB Basic Part: No; JLCPCB Part Number: C380317; Supplier 1: LCSC; Category: Capacitors - MLCC; Supplier Part Number 1: C380317; Tolerance: ±20%; Voltage Rating: 16V; Temperature Coefficient: X5R; RoHS: Yes; ComponentLink1Description: Datasheet; ComponentLink1URL: https://wmsc.lcsc.com/wmsc/upload/file/pdf/v2/lcsc/2304140030_CCTC-TCC0603X5R106M160CT_C380317.pdf; ComponentLink2Description: JLCPCB Part URL; ComponentLink2URL: https://jlcpcb.com/partdetail/C380317; ComponentLink3Description: LCSC Part URL; ComponentLink3URL: https://lcsc.com/product-detail/Multilayer-Ceramic-Capacitors-MLCC---SMD-SMT_CCTC-CCTC-TCC0603X5R106M160CT_C380317.html
footprint CAP-0603 (0603 (1608M) Capacitor)
pins: 1, 2
